# Altium footprint library 691 322 310 0xx.PcbLib: 23 footprints (part 2 of 2)
Each footprint in its own frame and in the unit in brackets; x right, y up, seen from the top. Pads: shape width x height; smd on the part's side, far side on the other; paste and mask are expansions set on the pad; w line width, h text height; cw(c..) or ccw(c..) is an arc to the next point about the centre after c.
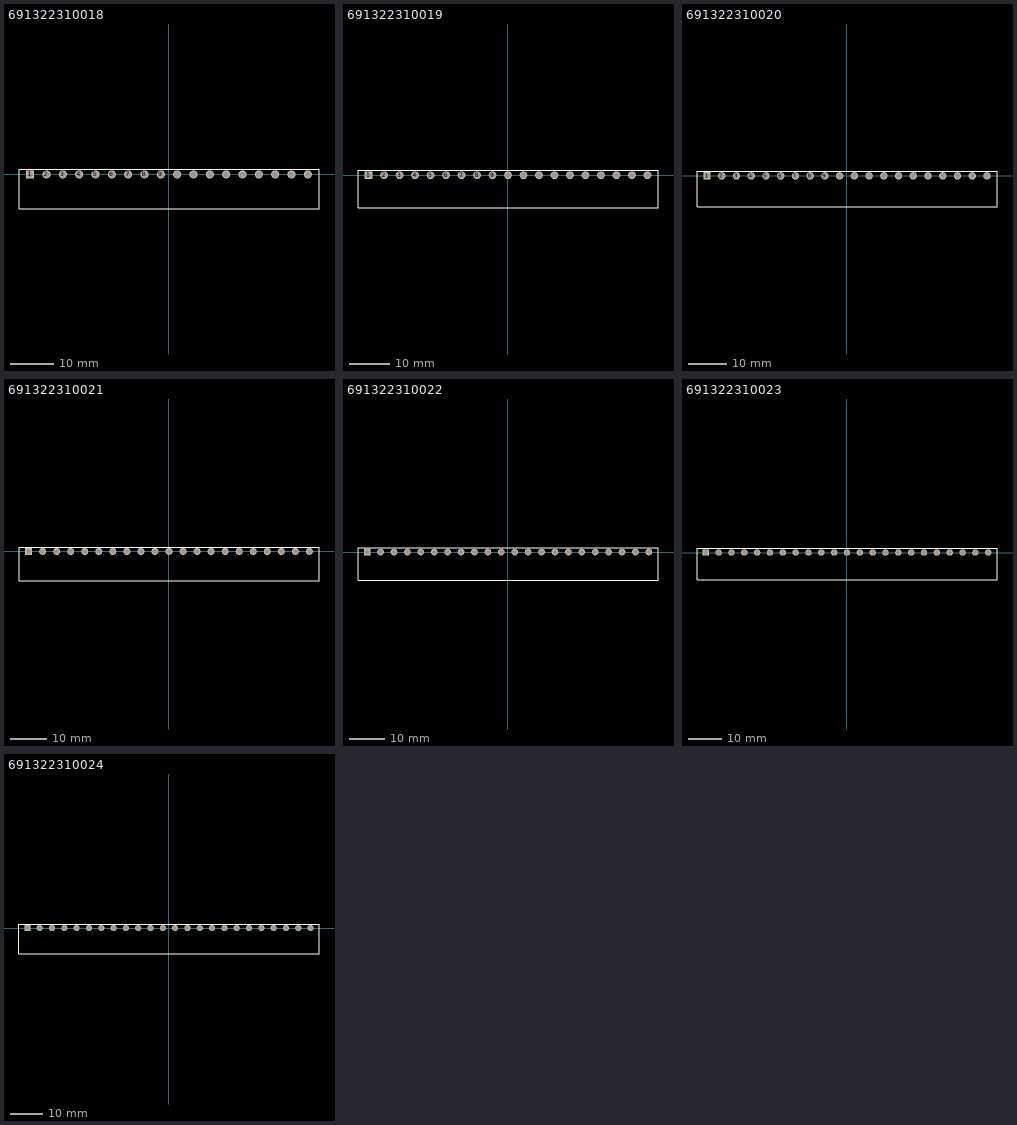
[diagram p1: the footprints below, top view; thin cyan lines are the x and y axes]

## 691322310018 [mm] "3,81mm - PCB Headers - Horizontal -18p"
height 7
pads (18):
  rect 1.9x1.9 hole 1.4: 1(-32.385,0)
  round 1.9 hole 1.4: 2(-28.575,0) 3(-24.765,0) 4(-20.955,0) 5(-17.145,0) 6(-13.335,0) 7(-9.525,0) 8(-5.715,0) 9(-1.905,0) 10(1.905,0) 11(5.715,0) 12(9.525,0) 13(13.335,0) 14(17.145,0) 15(20.955,0) 16(24.765,0) 17(28.575,0) 18(32.385,0)
Top Overlay:
  lines w0.127: -34.985,-8 -34.985,1.2 34.985,1.2 34.985,-8 -34.985,-8
3D body: height 7.21, standoff -3.49, extent -34.885,-8 34.885,1.2

## 691322310019 [mm] "3,81mm - PCB Headers - Horizontal - 19p"
height 7
pads (19):
  rect 1.9x1.9 hole 1.4: 1(-34.29,0)
  round 1.9 hole 1.4: 2(-30.48,0) 3(-26.67,0) 4(-22.86,0) 5(-19.05,0) 6(-15.24,0) 7(-11.43,0) 8(-7.62,0) 9(-3.81,0) 10(0,0) 11(3.81,0) 12(7.62,0) 13(11.43,0) 14(15.24,0) 15(19.05,0) 16(22.86,0) 17(26.67,0) 18(30.48,0) 19(34.29,0)
Top Overlay:
  lines w0.127: -36.89,-8 -36.89,1.2 36.89,1.2 36.89,-8 -36.89,-8
3D body: height 7.21, standoff -3.49, extent -36.79,-8 36.79,1.2

## 691322310020 [mm] "3,81mm - PCB Headers - Horizontal - 20p"
height 7
pads (20):
  rect 1.9x1.9 hole 1.4: 1(-36.195,0)
  round 1.9 hole 1.4: 2(-32.385,0) 3(-28.575,0) 4(-24.765,0) 5(-20.955,0) 6(-17.145,0) 7(-13.335,0) 8(-9.525,0) 9(-5.715,0) 10(-1.905,0) 11(1.905,0) 12(5.715,0) 13(9.525,0) 14(13.335,0) 15(17.145,0) 16(20.955,0) 17(24.765,0) 18(28.575,0) 19(32.385,0) 20(36.195,0)
Top Overlay:
  lines w0.127: -38.795,-8 -38.795,1.2 38.795,1.2 38.795,-8 -38.795,-8
3D body: height 7.21, standoff -3.49, extent -38.695,-8 38.695,1.2

## 691322310021 [mm] "3,81mm - PCB Headers - Horizontal - 21p"
height 7
pads (21):
  rect 1.9x1.9 hole 1.4: 1(-38.1,0)
  round 1.9 hole 1.4: 2(-34.29,0) 3(-30.48,0) 4(-26.67,0) 5(-22.86,0) 6(-19.05,0) 7(-15.24,0) 8(-11.43,0) 9(-7.62,0) 10(-3.81,0) 11(0,0) 12(3.81,0) 13(7.62,0) 14(11.43,0) 15(15.24,0) 16(19.05,0) 17(22.86,0) 18(26.67,0) 19(30.48,0) 20(34.29,0) 21(38.1,0)
Top Overlay:
  lines w0.127: -40.7,-8 40.7,-8 40.7,1.2 -40.7,1.2 -40.7,-8
3D body: height 7.21, standoff -3.49, extent -40.6,-8 40.6,1.2

## 691322310022 [mm] "3,81mm - PCB Headers - Horizontal - 22p"
height 7
pads (22):
  rect 1.9x1.9 hole 1.4: 1(-40.005,0)
  round 1.9 hole 1.4: 2(-36.195,0) 3(-32.385,0) 4(-28.575,0) 5(-24.765,0) 6(-20.955,0) 7(-17.145,0) 8(-13.335,0) 9(-9.525,0) 10(-5.715,0) 11(-1.905,0) 12(1.905,0) 13(5.715,0) 14(9.525,0) 15(13.335,0) 16(17.145,0) 17(20.955,0) 18(24.765,0) 19(28.575,0) 20(32.385,0) 21(36.195,0) 22(40.005,0)
Top Overlay:
  lines w0.127: -42.605,-8 -42.605,1.2 42.605,1.2 42.605,-8 -42.605,-8
3D body: height 7.21, standoff -3.49, extent -42.505,-8 42.505,1.2

## 691322310023 [mm] "3,81mm - PCB Headers - Horizontal - 23p"
height 7
pads (23):
  rect 1.9x1.9 hole 1.4: 1(-41.91,0)
  round 1.9 hole 1.4: 2(-38.1,0) 3(-34.29,0) 4(-30.48,0) 5(-26.67,0) 6(-22.86,0) 7(-19.05,0) 8(-15.24,0) 9(-11.43,0) 10(-7.62,0) 11(-3.81,0) 12(0,0) 13(3.81,0) 14(7.62,0) 15(11.43,0) 16(15.24,0) 17(19.05,0) 18(22.86,0) 19(26.67,0) 20(30.48,0) 21(34.29,0) 22(38.1,0) 23(41.91,0)
Top Overlay:
  lines w0.127: -44.51,-8 44.51,-8 44.51,1.2 -44.51,1.2 -44.51,-8
3D body: height 7.21, standoff -3.49, extent -44.41,-8 44.41,1.2

## 691322310024 [mm] "3,81mm - PCB Headers - Horizontal - 24p"
height 7
pads (24):
  rect 1.9x1.9 hole 1.4: 1(-43.815,0)
  round 1.9 hole 1.4: 2(-40.005,0) 3(-36.195,0) 4(-32.385,0) 5(-28.575,0) 6(-24.765,0) 7(-20.955,0) 8(-17.145,0) 9(-13.335,0) 10(-9.525,0) 11(-5.715,0) 12(-1.905,0) 13(1.905,0) 14(5.715,0) 15(9.525,0) 16(13.335,0) 17(17.145,0) 18(20.955,0) 19(24.765,0) 20(28.575,0) 21(32.385,0) 22(36.195,0) 23(40.005,0) 24(43.815,0)
Top Overlay:
  lines w0.127: -46.415,-8 46.415,-8 46.415,1.2 -46.415,1.2 -46.415,-8
3D body: height 7.21, standoff -3.49, extent -46.315,-8 46.315,1.2